# Altium footprint library EwgConnectors.PcbLib: 125 footprints (part 6 of 8)
Each footprint in its own frame and in the unit in brackets; x right, y up, seen from the top. Pads: shape width x height; smd on the part's side, far side on the other; paste and mask are expansions set on the pad; w line width, h text height; cw(c..) or ccw(c..) is an arc to the next point about the centre after c.
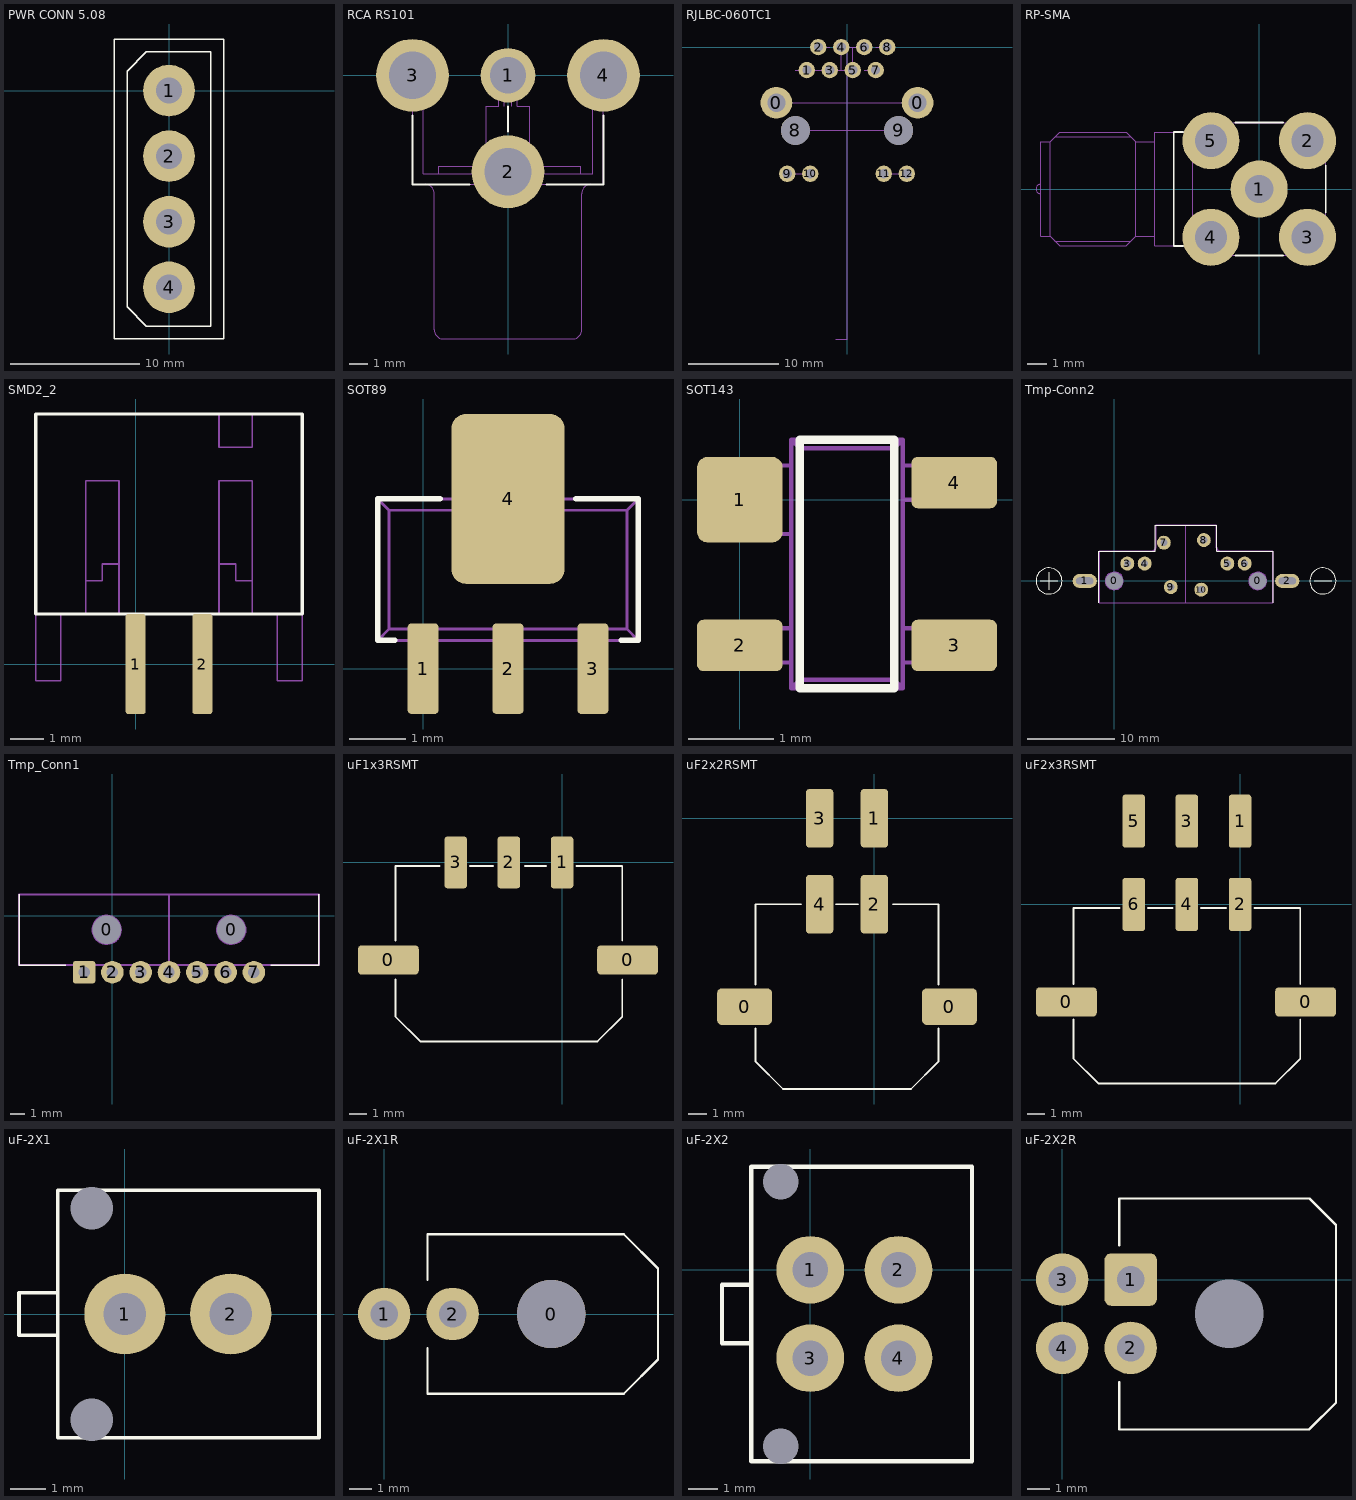
[diagram p5: the footprints below, top view; thin cyan lines are the x and y axes]

## PWR CONN 5.08 [mm]
pads (4):
  round 4 hole 2: 1(0,0) 2(0,-5.08) 3(0,-10.16) 4(0,-15.24)
Top Overlay:
  lines w0.1: -4.25,-19.25 4.25,-19.25 4.25,4 -4.25,4 -4.25,-19.25 ; -3.25,-16.75 -3.25,1.5 -1.75,3 3.25,3 3.25,-18.25 -1.75,-18.25 -3.25,-16.75
3D body: height 10.27, standoff -3.58, extent -4.14,-19.31 4.14,4.13

## RCA RS101 [mm]
pads (4):
  round 3 hole 2: 1(0,0)
  round 4 hole 2.6: 2(0,-5.3) 3(-5.25,0) 4(5.25,0)
Top Overlay:
  lines w0.1: -5.25,-2.2 -5.25,-6 -2.1,-6 ; 0,-3.1 0,-1.7 ; 2.1,-6 5.25,-6 5.25,-2.2
Mechanical 1:
  lines w0.05: -4.65,-1 -5.5,-1 -5.5,1 -5.25,1 ; -4.55,-6 cw(c-4.55,-6.5) -4.05,-6.5 -4.05,-14 ccw(c-3.55,-14) -3.55,-14.5 0,-14.5 3.55,-14.5 ccw(c3.55,-14) 4.05,-14 4.05,-6.5 cw(c4.55,-6.5) 4.55,-6 ; -3.8,-5.4 -3.8,-5 4,-5 4,-5.4 ; -1.2,-5 -1.2,-1.7 -0.5,-1.7 -0.5,0 -0.5,0.2 0,0.2 0.5,0.2 0.5,0 0.5,-1.7 1.2,-1.7 1.2,-5 ; -0.2,-1.7 -0.2,0.2 ; 0.2,-1.7 0.2,-1.5 0.2,0.2 ; 4.65,-1 5.5,-1 5.5,1 5.25,1 ; -5.25,1 -5.25,-6 0,-6 5.25,-6 5.25,1 ; -5.25,1 -4.65,1 -4.65,-5.4 4.65,-5.4 4.65,1 5.25,1

## RJLBC-060TC1 [mm]
pads (16):
  round 3.5 hole 2: 0(-7.798,-6.147) 0(7.798,-6.147)
  round 1.8 hole 1: 1(-4.445,-2.54) 2(-3.175,0) 3(-1.905,-2.54) 4(-0.635,0) 5(0.635,-2.54) 6(1.905,0) 7(3.175,-2.54) 8(4.445,0) 9(-6.604,-13.995) 10(-4.064,-13.995) 11(4.064,-13.995) 12(6.604,-13.995)
  round 3.2 hole 3.2 unplated: 8(-5.715,-9.195) 9(5.715,-9.195)
Mechanical 1:
  lines w0.1: -7.798,-6.147 7.798,-6.147 ; -6.604,-13.995 -4.064,-13.995 ; -5.715,-9.195 5.715,-9.195 ; -5.715,-2.54 0,-2.54 ; -4.445,-2.54 -3.175,-2.54 ; -4.064,-9.195 0,-9.195 ; -3.175,0 -1.905,0 ; -1.905,-2.54 -0.635,-2.54 ; -1.27,-32.258 0,-32.258 0,0 ; -0.635,-2.413 -0.635,0 ; 1.905,-2.54 3.175,-2.54 ; 1.905,0 0.635,0 ; 3.175,0 4.445,0 ; 4.064,-13.995 6.604,-13.995 ; -0.635,-2.54 -0.635,0 ; -0.635,-2.54 0.635,-2.54 0.635,0 ; -0.635,0 0.635,0
3D body: height 13.5, standoff -3, extent -8.001,-20.098 7.879,1.302

## RP-SMA [mm]
pads (5):
  round 3 hole 1.5: 1(0,0)
  round 3 hole 1.7: 2(2.54,2.54) 3(2.54,-2.54) 4(-2.54,-2.54) 5(-2.54,2.54)
Top Overlay:
  lines w0.1: -4,-3 -4.5,-3 -4.5,3 -4,3 ; -1.25,-3.5 1.25,-3.5 ; -1.25,3.5 1.25,3.5 ; 3.5,-1.25 3.5,1.25
Mechanical 1:
  lines w0.05: -11.5,-0.25 cw(c-11.5,0) -11.5,0.25 ; -10.75,-2.75 -6.75,-2.75 ; -10.75,2.75 -6.75,2.75 ; -3.5,-3 -5.5,-3 -5.5,-2.5 ; -3.5,3 -5.5,3 -5.5,2.5 ; -11,-2.5 -10.5,-3 -7,-3 -6.5,-2.5 ; -11,-2.5 -11,0 -11,2.5 ; -11,-2.5 -11.5,-2.5 -11.5,0 -11.5,2.5 -11,2.5 ; -11,2.5 -10.5,3 -7,3 -6.5,2.5 ; -6.5,-2.5 -6.5,0 -6.5,2.5 ; -6.5,-2.5 -5.5,-2.5 ; -6.5,2.5 -5.5,2.5 ; -5.5,-2.5 -5.5,0 -5.5,2.5 ; -3.5,-3.5 3.5,-3.5 3.5,3.5 -3.5,3.5 -3.5,-3.5

## SMD2_2 [mm]
pads (2):
  rrect25% 0.6x3 smd: 1(0,0) 2(2,0)
Top Overlay:
  lines w0.1: -3,1.5 -3,7.5 5,7.5 5,1.5 -3,1.5
Mechanical 1:
  lines w0.05: -1.5,1.5 -1.5,5.5 -0.5,5.5 -0.5,1.5 ; -1.5,2.5 -1,2.5 -1,3 -0.5,3 ; -0.25,1.25 0.25,1.25 ; -0.25,1.5 -0.25,-0.75 0.25,-0.75 0.25,1.5 ; 1.75,1.25 2.25,1.25 ; 1.75,1.5 1.75,-0.75 2.25,-0.75 2.25,1.5 ; 2.5,1.5 2.5,5.5 3.5,5.5 3.5,1.5 ; 2.5,3 3,3 3,2.5 3.5,2.5 ; 2.5,7.5 2.5,6.5 3.5,6.5 3.5,7.5 ; 5,1.5 4.25,1.5 ; -3,1.5 -3,-0.5 -2.25,-0.5 -2.25,1.5 ; -3,1.5 -2.25,1.5 ; -3,1.5 -3,7.5 5,7.5 5,-0.5 4.25,-0.5 4.25,1.5 ; -2.25,1.5 4.25,1.5

## SOT89 [mm]
pads (4):
  rrect25% 0.55x1.6 smd: 1(0,0) 2(1.5,0) 3(3,0)
  rrect25% 2x3 smd: 4(1.5,3)
Top Overlay:
  lines w0.1: -0.5,0.5 -0.8,0.5 -0.8,3 0.3,3 ; 2.7,3 3.8,3 3.8,0.5 3.5,0.5
Mechanical 1:
  lines w0.05: -0.2,0.5 -0.2,-0.3 0.2,-0.3 0.2,0.5 ; 0.7,3 0.7,3.5 1.1,3.9 1.9,3.9 2.3,3.5 2.3,3 ; 1.3,0.5 1.3,-0.3 1.7,-0.3 1.7,0.5 ; 2.8,0.5 2.8,-0.3 3.2,-0.3 3.2,0.5 ; -0.8,0.5 3.8,0.5 ; -0.8,0.5 -0.6,0.7 ; -0.8,0.5 -0.8,3 ; -0.8,3 3.8,3 ; -0.8,3 -0.6,2.8 ; -0.6,0.7 3.6,0.7 ; -0.6,0.7 -0.6,2.8 ; -0.6,2.8 3.6,2.8 ; 3.6,0.7 3.6,0.8 3.6,2.8 ; 3.6,0.7 3.8,0.5 ; 3.6,2.8 3.8,3 ; 3.8,0.5 3.8,3

## SOT143 [mm]
pads (4):
  rrect25% 1x1 smd: 1(0,0)
  rrect25% 1x0.6 smd: 2(0,-1.7) 3(2.5,-1.7) 4(2.5,0.2)
Top Overlay:
  lines w0.1: 0.7,-2.2 0.7,0.7 1.8,0.7 1.8,-2.2 0.7,-2.2
Mechanical 1:
  lines w0.05: 0.3,-1.9 0.3,-1.5 ; 0.3,-0.4 0.3,0.4 ; 0.6,-1.9 0,-1.9 0,-1.5 0.6,-1.5 ; 0.6,-0.4 0,-0.4 0,0.4 0.6,0.4 ; 1.9,-1.9 2.5,-1.9 2.5,-1.5 1.9,-1.5 ; 1.9,0 2.5,0 2.5,0.4 1.9,0.4 ; 2.2,-1.9 2.2,-1.5 ; 2.2,0 2.2,0.4 ; 0.6,-2.2 0.7,-2.1 ; 0.6,-2.2 0.6,0.7 ; 0.6,-2.2 1.9,-2.2 ; 0.6,0.7 0.7,0.6 ; 0.6,0.7 1.9,0.7 ; 0.7,-2.1 0.7,0.6 ; 0.7,-2.1 1.8,-2.1 ; 0.7,0.6 1.8,0.6 ; 1.8,-2.1 1.8,0.6 ; 1.8,-2.1 1.9,-2.2 ; 1.8,0.6 1.9,0.7 ; 1.9,-2.2 1.9,0.7

## Tmp-Conn2 [mm]
pads (12):
  round 1.6 hole 2 unplated: 0(0,0) 0(16.5,0)
  oval 2.8x1.6 hole 0.8 slot 2 at 0 deg: 1(-3.4,0) 2(19.9,0)
  round 1.6 hole 0.8: 3(1.5,2) 4(3.5,2) 5(13,2) 6(15,2) 7(5.7,4.4) 8(10.3,4.7) 9(6.5,-0.7) 10(10,-1)
Top Overlay:
  circle w0.1: c-7.5,0 r1.5
  circle w0.1: c24,0 r1.5
  lines w0.1: -8.5,0 -6.5,0 ; -7.5,-1 -7.5,1 ; -1.8,-2.5 -1.8,3.4 4.7,3.4 4.7,6.4 11.8,6.4 11.8,3.4 18.3,3.4 18.3,-2.5 ; 23,0 25,0
Mechanical 1:
  circle w0.15: c0,0 r1
  circle w0.15: c16.5,0 r1
  circle w0.15: c13,2 r0.4
  circle w0.15: c15,2 r0.4
  circle w0.15: c3.5,2 r0.4
  circle w0.15: c1.5,2 r0.4
  circle w0.15: c10,-1 r0.4
  circle w0.15: c6.5,-0.7 r0.4
  circle w0.15: c5.7,4.4 r0.4
  circle w0.15: c10.3,4.7 r0.4
  lines w0.1: -1.75,-2.5 18.25,-2.5 ; 8.25,6.4 8.25,-2.5 ; 8.25,-2.5 8.25,-2.5
  lines w0.15: -1.75,-2.5 -1.75,3.4 4.25,3.4 ccw(c4.25,3.9) 4.75,3.9 4.75,6.4 11.75,6.4 11.75,3.9 ccw(c12.25,3.9) 12.25,3.4 18.25,3.4 18.25,-2.5

## Tmp_Conn1 [mm]
pads (9):
  round 1.6 hole 2 unplated: 0(-0.4,-1) 0(8.4,-1)
  rrect25% 1.6x1.6 hole 0.8: 1(-2,-4)
  round 1.6 hole 0.8: 2(0,-4) 3(2,-4) 4(4,-4) 5(6,-4) 6(8,-4) 7(10,-4)
Top Overlay:
  lines w0.1: -6.6,1.5 -6.6,-3.5 -3.3,-3.5 ; 11.2,-3.5 14.6,-3.5 14.6,1.5
Mechanical 1:
  circle w0.15: c-0.4,-1 r1
  circle w0.15: c8.4,-1 r1
  lines w0.15: 4,-4 4,1.5 ; -6.6,-3.5 14.6,-3.5 14.6,1.5 -6.6,1.5 -6.6,-3.5

## uF1x3RSMT [mm] "uF1x3RSMT"
height 5.65
pads (5):
  rrect25% 3.43x1.65 smd: 0(-9.8,-5.5) 0(3.7,-5.5)
  rrect25% 1.27x2.92 smd: 1(0,0) 2(-3,0) 3(-6,0)
Top Overlay:
  lines w0.1: -9.4,-6.6 -9.4,-8.7 -8,-10.1 2,-10.1 3.4,-8.7 3.4,-6.6 ; -9.4,-4.4 -9.4,-0.2 -6.9,-0.2 ; -5.2,-0.2 -3.9,-0.2 ; -2.1,-0.2 -0.9,-0.2 ; 0.8,-0.2 3.4,-0.2 3.4,-4.4
3D body: height 5.68, standoff 0, extent -11.325,-10.1 5.325,0.64
3D body: height 6.96, standoff -0.14, extent -7.93,-17.4 1.92,-3.4

## uF2x2RSMT [mm] "uF2x2RSMT"
pads (6):
  rrect25% 3x2 smd: 0(-7.1,-10.3) 0(4.1,-10.3)
  rrect25% 1.5x3.2 smd: 1(0,0) 2(0,-4.7) 3(-3,0) 4(-3,-4.7)
Top Overlay:
  lines w0.1: -6.5,-11.5 -6.5,-13.3 -5,-14.8 2,-14.8 3.5,-13.3 3.5,-11.5 ; -6.5,-9.1 -6.5,-4.7 -4,-4.7 ; -2.1,-4.7 -0.9,-4.7 ; 1,-4.7 3.5,-4.7 3.5,-9.1
3D body: height 10.7, standoff -0.14, extent -5.63,-22.5 2.63,-8.5
3D body: height 8.9, standoff 0, extent -8,-14.8 5,1.2

## uF2x3RSMT [mm] "uF2x3RSMT"
height 9
pads (8):
  rrect25% 3.43x1.65 smd: 0(-9.8,-5.5) 0(3.7,-5.5)
  rrect25% 1.27x3 smd: 1(0,4.7) 2(0,0) 3(-3,4.7) 4(-3,0) 5(-6,4.7) 6(-6,0)
Top Overlay:
  lines w0.1: -9.4,-6.5 -9.4,-8.7 -8,-10.1 2,-10.1 3.4,-8.7 3.4,-6.5 ; -9.4,-4.5 -9.4,-0.2 -6.8,-0.2 ; -5.2,-0.2 -3.8,-0.2 ; -2.2,-0.2 -0.8,-0.2 ; 0.8,-0.2 3.4,-0.2 3.4,-4.5
3D body: height 8.77, standoff -0.04, extent -11.325,-10 5.325,5.4

## uF-2X1 [mm]
height 10
pads (4):
  round 0 hole 1.2 unplated: 0(-0.94,-3) 0(-0.94,3)
  round 2.3 hole 1.2: 1(0,0) 2(3,0)
Top Overlay:
  lines w0.1: -1.9,-0.6 -3,-0.6 -3,0.6 -1.9,0.6 ; -1.9,-3.5 -1.9,0 -1.9,3.5 5.5,3.5 5.5,-3.5 -1.9,-3.5
3D body: height 9.91, standoff -3.18, extent -3.285,-3.6 5.485,3.55

## uF-2X1R [mm]
pads (3):
  round 3 hole 3 unplated: 0(7.32,0)
  round 2.3 hole 1.2: 1(0,0) 2(3,0)
Top Overlay:
  lines w0.1: 1.9,-1.5 1.9,-3.5 10.5,-3.5 12,-2 12,2 10.5,3.5 1.9,3.5 1.9,1.5
3D body: height 8.77, standoff -3.17, extent -0.32,-3.6 11.92,3.55

## uF-2X2 [mm]
height 10
pads (6):
  round 0 hole 1.2 unplated: 0(-1,-6) 0(-1,3)
  round 2.3 hole 1.2: 1(0,0) 2(3,0) 3(0,-3) 4(3,-3)
Top Overlay:
  lines w0.15: -2,-2.5 -3,-2.5 -3,-0.5 -2,-0.5 ; -2,-6.5 5.5,-6.5 5.5,3.5 -2,3.5 -2,-6.5
3D body: height 9.95, standoff -3.14, extent -3.325,-6.575 5.445,3.575

## uF-2X2R [mm]
height 10
pads (5):
  round 0 hole 3: 0(7.32,-1.5)
  rrect25% 2.3x2.3 hole 1.2: 1(3,0)
  round 2.3 hole 1.2: 2(3,-3) 3(0,0) 4(0,-3)
Top Overlay:
  lines w0.1: 2.5,-4.5 2.5,-6.579 10.82,-6.579 12,-5.399 12,2.391 10.835,3.556 2.5,3.556 2.5,1.5
3D body: height 8.79, standoff -3.16, extent -0.343,-6.59 11.905,3.567